# Altium integrated library 860010580021_Altium_WCAP-ATG8_rev20a.IntLib: 195 symbols (part 1 of 2)
Pins are listed as number, name and electrical type; pins without a type are passive.

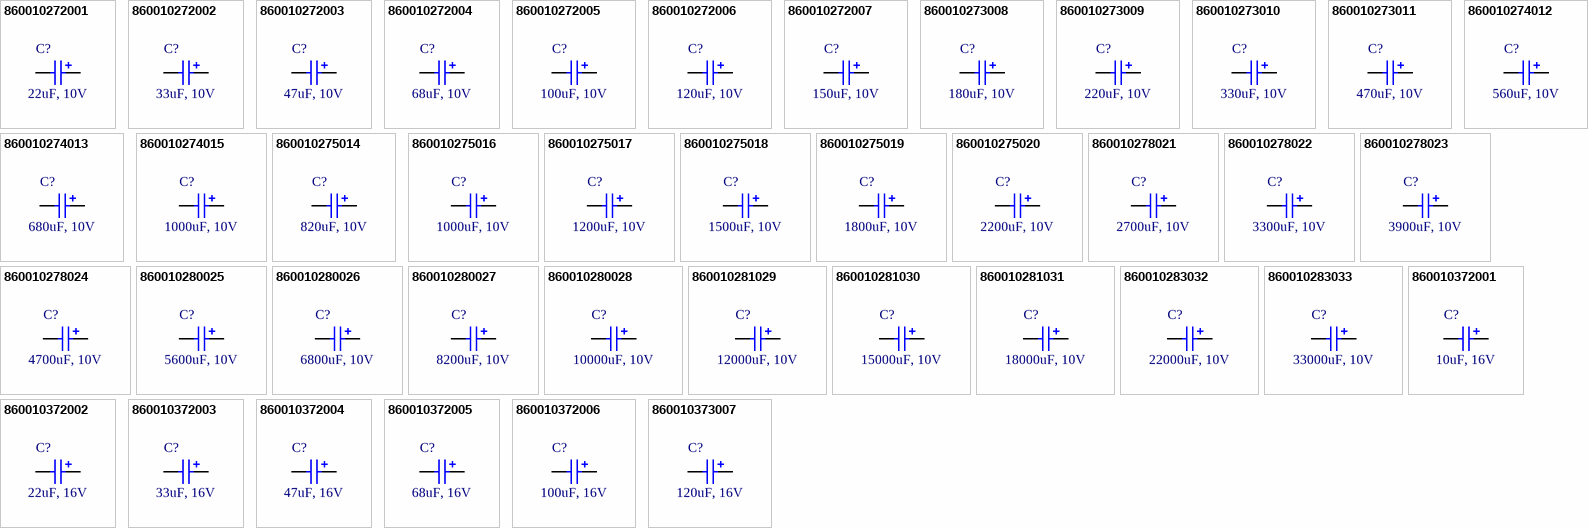
[diagram p0: symbols 860010272001 to 860010373007]

## 860010272001
designator C?, comment 22uF, 10V
WCAP-ATG8 Aluminum Electrolytic Capacitor, Radial, THT, D5xH11mm, 22uF, 10V; Manufacturer Part Number: 860010272001; Manufacturer: Wurth Elektronik; Dissipation Factor: 19%; Endurance: 2000h; Leakage Current: 3uA; Ripple Current: 66mA; Capacitance Tolerance: +/-20%; Rated Voltage: 10VDC; Technical Reference: ATBC110220M010DSPA3B000; ComponentLink1Description: Manufacturer; ComponentLink1URL: http://www.we-online.de; ComponentLink2Description: Datasheet; ComponentLink2URL: https://www.we-online.com/catalog/datasheet/860010272001.pdf; Height: 11mm; Mounting Technology: THT; Operating Temperature: -40 to +85degC; Packaging: Ammo Pack; Published Date: May 2020; Capacitance: 22uF; Diameter: 5mm
footprint WCAP-ATG8_5x11
pins: 1 N, 2 P

## 860010272002
designator C?, comment 33uF, 10V
WCAP-ATG8 Aluminum Electrolytic Capacitor, Radial, THT, D5xH11mm, 33uF, 10V; Manufacturer Part Number: 860010272002; Manufacturer: Wurth Elektronik; Dissipation Factor: 19%; Endurance: 2000h; Leakage Current: 3.3uA; Ripple Current: 88mA; Capacitance Tolerance: +/-20%; Rated Voltage: 10VDC; Technical Reference: ATBC110330M010DSPA3B000; ComponentLink1Description: Manufacturer; ComponentLink1URL: http://www.we-online.de; ComponentLink2Description: Datasheet; ComponentLink2URL: https://www.we-online.com/catalog/datasheet/860010272002.pdf; Height: 11mm; Mounting Technology: THT; Operating Temperature: -40 to +85degC; Packaging: Ammo Pack; Published Date: May 2020; Capacitance: 33uF; Diameter: 5mm
footprint WCAP-ATG8_5x11
pins: 1 N, 2 P

## 860010272003
designator C?, comment 47uF, 10V
WCAP-ATG8 Aluminum Electrolytic Capacitor, Radial, THT, D5xH11mm, 47uF, 10V; Manufacturer Part Number: 860010272003; Manufacturer: Wurth Elektronik; Dissipation Factor: 19%; Endurance: 2000h; Leakage Current: 4.7uA; Ripple Current: 105mA; Capacitance Tolerance: +/-20%; Rated Voltage: 10VDC; Technical Reference: ATBC110470M010DSPA3B000; ComponentLink1Description: Manufacturer; ComponentLink1URL: http://www.we-online.de; ComponentLink2Description: Datasheet; ComponentLink2URL: https://www.we-online.com/catalog/datasheet/860010272003.pdf; Height: 11mm; Mounting Technology: THT; Operating Temperature: -40 to +85degC; Packaging: Ammo Pack; Published Date: May 2020; Capacitance: 47uF; Diameter: 5mm
footprint WCAP-ATG8_5x11
pins: 1 N, 2 P

## 860010272004
designator C?, comment 68uF, 10V
WCAP-ATG8 Aluminum Electrolytic Capacitor, Radial, THT, D5xH11mm, 68uF, 10V; Manufacturer Part Number: 860010272004; Manufacturer: Wurth Elektronik; Dissipation Factor: 19%; Endurance: 2000h; Leakage Current: 6.8uA; Ripple Current: 132mA; Capacitance Tolerance: +/-20%; Rated Voltage: 10VDC; Technical Reference: ATBC110680M010DSPA3B000; ComponentLink1Description: Manufacturer; ComponentLink1URL: http://www.we-online.de; ComponentLink2Description: Datasheet; ComponentLink2URL: https://www.we-online.com/catalog/datasheet/860010272004.pdf; Height: 11mm; Mounting Technology: THT; Operating Temperature: -40 to +85degC; Packaging: Ammo Pack; Published Date: May 2020; Capacitance: 68uF; Diameter: 5mm
footprint WCAP-ATG8_5x11
pins: 1 N, 2 P

## 860010272005
designator C?, comment 100uF, 10V
WCAP-ATG8 Aluminum Electrolytic Capacitor, Radial, THT, D5xH11mm, 100uF, 10V; Manufacturer Part Number: 860010272005; Manufacturer: Wurth Elektronik; Dissipation Factor: 19%; Endurance: 2000h; Leakage Current: 10uA; Ripple Current: 198mA; Capacitance Tolerance: +/-20%; Rated Voltage: 10VDC; Technical Reference: ATBC110101M010DSPA3B000; ComponentLink1Description: Manufacturer; ComponentLink1URL: http://www.we-online.de; ComponentLink2Description: Datasheet; ComponentLink2URL: https://www.we-online.com/catalog/datasheet/860010272005.pdf; Height: 11mm; Mounting Technology: THT; Operating Temperature: -40 to +85degC; Packaging: Ammo Pack; Published Date: May 2020; Capacitance: 100uF; Diameter: 5mm
footprint WCAP-ATG8_5x11
pins: 1 N, 2 P

## 860010272006
designator C?, comment 120uF, 10V
WCAP-ATG8 Aluminum Electrolytic Capacitor, Radial, THT, D5xH11mm, 120uF, 10V; Manufacturer Part Number: 860010272006; Manufacturer: Wurth Elektronik; Dissipation Factor: 19%; Endurance: 2000h; Leakage Current: 12uA; Ripple Current: 209mA; Capacitance Tolerance: +/-20%; Rated Voltage: 10VDC; Technical Reference: ATBC110121M010DSPA3B000; ComponentLink1Description: Manufacturer; ComponentLink1URL: http://www.we-online.de; ComponentLink2Description: Datasheet; ComponentLink2URL: https://www.we-online.com/catalog/datasheet/860010272006.pdf; Height: 11mm; Mounting Technology: THT; Operating Temperature: -40 to +85degC; Packaging: Ammo Pack; Published Date: May 2020; Capacitance: 120uF; Diameter: 5mm
footprint WCAP-ATG8_5x11
pins: 1 N, 2 P

## 860010272007
designator C?, comment 150uF, 10V
WCAP-ATG8 Aluminum Electrolytic Capacitor, Radial, THT, D5xH11mm, 150uF, 10V; Manufacturer Part Number: 860010272007; Manufacturer: Wurth Elektronik; Dissipation Factor: 19%; Endurance: 2000h; Leakage Current: 15uA; Ripple Current: 231mA; Capacitance Tolerance: +/-20%; Rated Voltage: 10VDC; Technical Reference: ATBC110151M010DSPA3B000; ComponentLink1Description: Manufacturer; ComponentLink1URL: http://www.we-online.de; ComponentLink2Description: Datasheet; ComponentLink2URL: https://www.we-online.com/catalog/datasheet/860010272007.pdf; Height: 11mm; Mounting Technology: THT; Operating Temperature: -40 to +85degC; Packaging: Ammo Pack; Published Date: May 2020; Capacitance: 150uF; Diameter: 5mm
footprint WCAP-ATG8_5x11
pins: 1 N, 2 P

## 860010273008
designator C?, comment 180uF, 10V
WCAP-ATG8 Aluminum Electrolytic Capacitor, Radial, THT, D6.3xH11mm, 180uF, 10V; Manufacturer Part Number: 860010273008; Manufacturer: Wurth Elektronik; Dissipation Factor: 19%; Endurance: 2000h; Leakage Current: 18uA; Ripple Current: 253mA; Capacitance Tolerance: +/-20%; Rated Voltage: 10VDC; Technical Reference: ATBD110181M010DSPA4B000; ComponentLink1Description: Manufacturer; ComponentLink1URL: http://www.we-online.de; ComponentLink2Description: Datasheet; ComponentLink2URL: https://www.we-online.com/catalog/datasheet/860010273008.pdf; Height: 11mm; Mounting Technology: THT; Operating Temperature: -40 to +85degC; Packaging: Ammo Pack; Published Date: May 2020; Capacitance: 180uF; Diameter: 6.3mm
footprint WCAP-ATG8_6.3x11
pins: 1 N, 2 P

## 860010273009
designator C?, comment 220uF, 10V
WCAP-ATG8 Aluminum Electrolytic Capacitor, Radial, THT, D6.3xH11mm, 220uF, 10V; Manufacturer Part Number: 860010273009; Manufacturer: Wurth Elektronik; Dissipation Factor: 19%; Endurance: 2000h; Leakage Current: 22uA; Ripple Current: 294mA; Capacitance Tolerance: +/-20%; Rated Voltage: 10VDC; Technical Reference: ATBD110221M010DSPA4B000; ComponentLink1Description: Manufacturer; ComponentLink1URL: http://www.we-online.de; ComponentLink2Description: Datasheet; ComponentLink2URL: https://www.we-online.com/catalog/datasheet/860010273009.pdf; Height: 11mm; Mounting Technology: THT; Operating Temperature: -40 to +85degC; Packaging: Ammo Pack; Published Date: May 2020; Capacitance: 220uF; Diameter: 6.3mm
footprint WCAP-ATG8_6.3x11
pins: 1 N, 2 P

## 860010273010
designator C?, comment 330uF, 10V
WCAP-ATG8 Aluminum Electrolytic Capacitor, Radial, THT, D6.3xH11mm, 330uF, 10V; Manufacturer Part Number: 860010273010; Manufacturer: Wurth Elektronik; Dissipation Factor: 19%; Endurance: 2000h; Leakage Current: 33uA; Ripple Current: 363mA; Capacitance Tolerance: +/-20%; Rated Voltage: 10VDC; Technical Reference: ATBD110331M010DSPA4B000; ComponentLink1Description: Manufacturer; ComponentLink1URL: http://www.we-online.de; ComponentLink2Description: Datasheet; ComponentLink2URL: https://www.we-online.com/catalog/datasheet/860010273010.pdf; Height: 11mm; Mounting Technology: THT; Operating Temperature: -40 to +85degC; Packaging: Ammo Pack; Published Date: May 2020; Capacitance: 330uF; Diameter: 6.3mm
footprint WCAP-ATG8_6.3x11
pins: 1 N, 2 P

## 860010273011
designator C?, comment 470uF, 10V
WCAP-ATG8 Aluminum Electrolytic Capacitor, Radial, THT, D6.3xH11mm, 470uF, 10V; Manufacturer Part Number: 860010273011; Manufacturer: Wurth Elektronik; Dissipation Factor: 19%; Endurance: 2000h; Leakage Current: 47uA; Ripple Current: 418mA; Capacitance Tolerance: +/-20%; Rated Voltage: 10VDC; Technical Reference: ATBD110471M010DSPA4B000; ComponentLink1Description: Manufacturer; ComponentLink1URL: http://www.we-online.de; ComponentLink2Description: Datasheet; ComponentLink2URL: https://www.we-online.com/catalog/datasheet/860010273011.pdf; Height: 11mm; Mounting Technology: THT; Operating Temperature: -40 to +85degC; Packaging: Ammo Pack; Published Date: May 2020; Capacitance: 470uF; Diameter: 6.3mm
footprint WCAP-ATG8_6.3x11
pins: 1 N, 2 P

## 860010274012
designator C?, comment 560uF, 10V
WCAP-ATG8 Aluminum Electrolytic Capacitor, Radial, THT, D8xH11.5mm, 560uF, 10V; Manufacturer Part Number: 860010274012; Manufacturer: Wurth Elektronik; Dissipation Factor: 19%; Endurance: 2000h; Leakage Current: 56uA; Ripple Current: 506mA; Capacitance Tolerance: +/-20%; Rated Voltage: 10VDC; Technical Reference: ATBE115561M010DSPA7B000; ComponentLink1Description: Manufacturer; ComponentLink1URL: http://www.we-online.de; ComponentLink2Description: Datasheet; ComponentLink2URL: https://www.we-online.com/catalog/datasheet/860010274012.pdf; Height: 11.5mm; Mounting Technology: THT; Operating Temperature: -40 to +85degC; Packaging: Ammo Pack; Published Date: May 2020; Capacitance: 560uF; Diameter: 8mm
footprint WCAP-ATG8_8x11.5
pins: 1 N, 2 P

## 860010274013
designator C?, comment 680uF, 10V
WCAP-ATG8 Aluminum Electrolytic Capacitor, Radial, THT, D8xH11.5mm, 680uF, 10V; Manufacturer Part Number: 860010274013; Manufacturer: Wurth Elektronik; Dissipation Factor: 19%; Endurance: 2000h; Leakage Current: 68uA; Ripple Current: 572mA; Capacitance Tolerance: +/-20%; Rated Voltage: 10VDC; Technical Reference: ATBE115681M010DSPA7B000; ComponentLink1Description: Manufacturer; ComponentLink1URL: http://www.we-online.de; ComponentLink2Description: Datasheet; ComponentLink2URL: https://www.we-online.com/catalog/datasheet/860010274013.pdf; Height: 11.5mm; Mounting Technology: THT; Operating Temperature: -40 to +85degC; Packaging: Ammo Pack; Published Date: May 2020; Capacitance: 680uF; Diameter: 8mm
footprint WCAP-ATG8_8x11.5
pins: 1 N, 2 P

## 860010274015
designator C?, comment 1000uF, 10V
WCAP-ATG8 Aluminum Electrolytic Capacitor, Radial, THT, D8xH16mm, 1000uF, 10V; Manufacturer Part Number: 860010274015; Manufacturer: Wurth Elektronik; Dissipation Factor: 19%; Endurance: 2000h; Leakage Current: 100uA; Ripple Current: 725mA; Capacitance Tolerance: +/-20%; Rated Voltage: 10VDC; Technical Reference: ATBE160102M010DSPA7B000; ComponentLink1Description: Manufacturer; ComponentLink1URL: http://www.we-online.de; ComponentLink2Description: Datasheet; ComponentLink2URL: https://www.we-online.com/catalog/datasheet/860010274015.pdf; Height: 16mm; Mounting Technology: THT; Operating Temperature: -40 to +85degC; Packaging: Ammo Pack; Published Date: May 2020; Capacitance: 1000uF; Diameter: 8mm
footprint WCAP-ATG8_8x16
pins: 1 N, 2 P

## 860010275014
designator C?, comment 820uF, 10V
WCAP-ATG8 Aluminum Electrolytic Capacitor, Radial, THT, D10xH12.5mm, 820uF, 10V; Manufacturer Part Number: 860010275014; Manufacturer: Wurth Elektronik; Dissipation Factor: 19%; Endurance: 2000h; Leakage Current: 82uA; Ripple Current: 671mA; Capacitance Tolerance: +/-20%; Rated Voltage: 10VDC; Technical Reference: ATBF125821M010DSPA9B000; ComponentLink1Description: Manufacturer; ComponentLink1URL: http://www.we-online.de; ComponentLink2Description: Datasheet; ComponentLink2URL: https://www.we-online.com/catalog/datasheet/860010275014.pdf; Height: 12.5mm; Mounting Technology: THT; Operating Temperature: -40 to +85degC; Packaging: Ammo Pack; Published Date: May 2020; Capacitance: 820uF; Diameter: 10mm
footprint WCAP-ATG8_10x12.5
pins: 1 N, 2 P

## 860010275016
designator C?, comment 1000uF, 10V
WCAP-ATG8 Aluminum Electrolytic Capacitor, Radial, THT, D10xH12.5mm, 1000uF, 10V; Manufacturer Part Number: 860010275016; Manufacturer: Wurth Elektronik; Dissipation Factor: 19%; Endurance: 2000h; Leakage Current: 100uA; Ripple Current: 726mA; Capacitance Tolerance: +/-20%; Rated Voltage: 10VDC; Technical Reference: ATBF125102M010DSPA9B000; ComponentLink1Description: Manufacturer; ComponentLink1URL: http://www.we-online.de; ComponentLink2Description: Datasheet; ComponentLink2URL: https://www.we-online.com/catalog/datasheet/860010275016.pdf; Height: 12.5mm; Mounting Technology: THT; Operating Temperature: -40 to +85degC; Packaging: Ammo Pack; Published Date: May 2020; Capacitance: 1000uF; Diameter: 10mm
footprint WCAP-ATG8_10x12.5
pins: 1 N, 2 P

## 860010275017
designator C?, comment 1200uF, 10V
WCAP-ATG8 Aluminum Electrolytic Capacitor, Radial, THT, D10xH16mm, 1200uF, 10V; Manufacturer Part Number: 860010275017; Manufacturer: Wurth Elektronik; Dissipation Factor: 19%; Endurance: 2000h; Leakage Current: 120uA; Ripple Current: 902mA; Capacitance Tolerance: +/-20%; Rated Voltage: 10VDC; Technical Reference: ATBF160122M010DSPAAB000; ComponentLink1Description: Manufacturer; ComponentLink1URL: http://www.we-online.de; ComponentLink2Description: Datasheet; ComponentLink2URL: https://www.we-online.com/catalog/datasheet/860010275017.pdf; Height: 16mm; Mounting Technology: THT; Operating Temperature: -40 to +85degC; Packaging: Ammo Pack; Published Date: May 2020; Capacitance: 1200uF; Diameter: 10mm
footprint WCAP-ATG8_10x16
pins: 1 N, 2 P

## 860010275018
designator C?, comment 1500uF, 10V
WCAP-ATG8 Aluminum Electrolytic Capacitor, Radial, THT, D10xH16mm, 1500uF, 10V; Manufacturer Part Number: 860010275018; Manufacturer: Wurth Elektronik; Dissipation Factor: 19%; Endurance: 2000h; Leakage Current: 150uA; Ripple Current: 1001mA; Capacitance Tolerance: +/-20%; Rated Voltage: 10VDC; Technical Reference: ATBF160152M010DSPAAB000; ComponentLink1Description: Manufacturer; ComponentLink1URL: http://www.we-online.de; ComponentLink2Description: Datasheet; ComponentLink2URL: https://www.we-online.com/catalog/datasheet/860010275018.pdf; Height: 16mm; Mounting Technology: THT; Operating Temperature: -40 to +85degC; Packaging: Ammo Pack; Published Date: May 2020; Capacitance: 1500uF; Diameter: 10mm
footprint WCAP-ATG8_10x16
pins: 1 N, 2 P

## 860010275019
designator C?, comment 1800uF, 10V
WCAP-ATG8 Aluminum Electrolytic Capacitor, Radial, THT, D10xH20mm, 1800uF, 10V; Manufacturer Part Number: 860010275019; Manufacturer: Wurth Elektronik; Dissipation Factor: 19%; Endurance: 2000h; Leakage Current: 180uA; Ripple Current: 1089mA; Capacitance Tolerance: +/-20%; Rated Voltage: 10VDC; Technical Reference: ATBF200182M010DSPAAB000; ComponentLink1Description: Manufacturer; ComponentLink1URL: http://www.we-online.de; ComponentLink2Description: Datasheet; ComponentLink2URL: https://www.we-online.com/catalog/datasheet/860010275019.pdf; Height: 20mm; Mounting Technology: THT; Operating Temperature: -40 to +85degC; Packaging: Ammo Pack; Published Date: May 2020; Capacitance: 1800uF; Diameter: 10mm
footprint WCAP-ATG8_10x20
pins: 1 N, 2 P

## 860010275020
designator C?, comment 2200uF, 10V
WCAP-ATG8 Aluminum Electrolytic Capacitor, Radial, THT, D10xH20mm, 2200uF, 10V; Manufacturer Part Number: 860010275020; Manufacturer: Wurth Elektronik; Dissipation Factor: 19%; Endurance: 2000h; Leakage Current: 220uA; Ripple Current: 1210mA; Capacitance Tolerance: +/-20%; Rated Voltage: 10VDC; Technical Reference: ATBF200222M010DSPAAB000; ComponentLink1Description: Manufacturer; ComponentLink1URL: http://www.we-online.de; ComponentLink2Description: Datasheet; ComponentLink2URL: https://www.we-online.com/catalog/datasheet/860010275020.pdf; Height: 20mm; Mounting Technology: THT; Operating Temperature: -40 to +85degC; Packaging: Ammo Pack; Published Date: May 2020; Capacitance: 2200uF; Diameter: 10mm
footprint WCAP-ATG8_10x20
pins: 1 N, 2 P

## 860010278021
designator C?, comment 2700uF, 10V
WCAP-ATG8 Aluminum Electrolytic Capacitor, Radial, THT, D13xH20mm, 2700uF, 10V; Manufacturer Part Number: 860010278021; Manufacturer: Wurth Elektronik; Dissipation Factor: 19%; Endurance: 2000h; Leakage Current: 270uA; Ripple Current: 1419mA; Capacitance Tolerance: +/-20%; Rated Voltage: 10VDC; Technical Reference: ATBI200272M010DSPACB000; ComponentLink1Description: Manufacturer; ComponentLink1URL: http://www.we-online.de; ComponentLink2Description: Datasheet; ComponentLink2URL: https://www.we-online.com/catalog/datasheet/860010278021.pdf; Height: 20mm; Mounting Technology: THT; Operating Temperature: -40 to +85degC; Packaging: Ammo Pack; Published Date: May 2020; Capacitance: 2700uF; Diameter: 13mm
footprint WCAP-ATG8_13x20
pins: 1 N, 2 P

## 860010278022
designator C?, comment 3300uF, 10V
WCAP-ATG8 Aluminum Electrolytic Capacitor, Radial, THT, D13xH20mm, 3300uF, 10V; Manufacturer Part Number: 860010278022; Manufacturer: Wurth Elektronik; Dissipation Factor: 19%; Endurance: 2000h; Leakage Current: 330uA; Ripple Current: 1540mA; Capacitance Tolerance: +/-20%; Rated Voltage: 10VDC; Technical Reference: ATBI200332M010DSPACB000; ComponentLink1Description: Manufacturer; ComponentLink1URL: http://www.we-online.de; ComponentLink2Description: Datasheet; ComponentLink2URL: https://www.we-online.com/catalog/datasheet/860010278022.pdf; Height: 20mm; Mounting Technology: THT; Operating Temperature: -40 to +85degC; Packaging: Ammo Pack; Published Date: May 2020; Capacitance: 3300uF; Diameter: 13mm
footprint WCAP-ATG8_13x20
pins: 1 N, 2 P

## 860010278023
designator C?, comment 3900uF, 10V
WCAP-ATG8 Aluminum Electrolytic Capacitor, Radial, THT, D13xH20mm, 3900uF, 10V; Manufacturer Part Number: 860010278023; Manufacturer: Wurth Elektronik; Dissipation Factor: 19%; Endurance: 2000h; Leakage Current: 390uA; Ripple Current: 1760mA; Capacitance Tolerance: +/-20%; Rated Voltage: 10VDC; Technical Reference: ATBI200392M010DSPACB000; ComponentLink1Description: Manufacturer; ComponentLink1URL: http://www.we-online.de; ComponentLink2Description: Datasheet; ComponentLink2URL: https://www.we-online.com/catalog/datasheet/860010278023.pdf; Height: 20mm; Mounting Technology: THT; Operating Temperature: -40 to +85degC; Packaging: Ammo Pack; Published Date: May 2020; Capacitance: 3900uF; Diameter: 13mm
footprint WCAP-ATG8_13x20
pins: 1 N, 2 P

## 860010278024
designator C?, comment 4700uF, 10V
WCAP-ATG8 Aluminum Electrolytic Capacitor, Radial, THT, D13xH25mm, 4700uF, 10V; Manufacturer Part Number: 860010278024; Manufacturer: Wurth Elektronik; Dissipation Factor: 19%; Endurance: 2000h; Leakage Current: 470uA; Ripple Current: 1980mA; Capacitance Tolerance: +/-20%; Rated Voltage: 10VDC; Technical Reference: ATBI250472M010DSPACB000; ComponentLink1Description: Manufacturer; ComponentLink1URL: http://www.we-online.de; ComponentLink2Description: Datasheet; ComponentLink2URL: https://www.we-online.com/catalog/datasheet/860010278024.pdf; Height: 25mm; Mounting Technology: THT; Operating Temperature: -40 to +85degC; Packaging: Ammo Pack; Published Date: May 2020; Capacitance: 4700uF; Diameter: 13mm
footprint WCAP-ATG8_13x25
pins: 1 N, 2 P

## 860010280025
designator C?, comment 5600uF, 10V
WCAP-ATG8 Aluminum Electrolytic Capacitor, Radial, THT, D16xH25mm, 5600uF, 10V; Manufacturer Part Number: 860010280025; Manufacturer: Wurth Elektronik; Dissipation Factor: 19%; Endurance: 2000h; Leakage Current: 560uA; Ripple Current: 2189mA; Capacitance Tolerance: +/-20%; Rated Voltage: 10VDC; Technical Reference: ATBK250562M010DSPAEB000; ComponentLink1Description: Manufacturer; ComponentLink1URL: http://www.we-online.de; ComponentLink2Description: Datasheet; ComponentLink2URL: https://www.we-online.com/catalog/datasheet/860010280025.pdf; Height: 25mm; Mounting Technology: THT; Operating Temperature: -40 to +85degC; Packaging: Ammo Pack; Published Date: May 2020; Capacitance: 5600uF; Diameter: 16mm
footprint WCAP-ATG8_16x25
pins: 1 N, 2 P

## 860010280026
designator C?, comment 6800uF, 10V
WCAP-ATG8 Aluminum Electrolytic Capacitor, Radial, THT, D16xH25mm, 6800uF, 10V; Manufacturer Part Number: 860010280026; Manufacturer: Wurth Elektronik; Dissipation Factor: 19%; Endurance: 2000h; Leakage Current: 680uA; Ripple Current: 2475mA; Capacitance Tolerance: +/-20%; Rated Voltage: 10VDC; Technical Reference: ATBK250682M010DSPAEB000; ComponentLink1Description: Manufacturer; ComponentLink1URL: http://www.we-online.de; ComponentLink2Description: Datasheet; ComponentLink2URL: https://www.we-online.com/catalog/datasheet/860010280026.pdf; Height: 25mm; Mounting Technology: THT; Operating Temperature: -40 to +85degC; Packaging: Ammo Pack; Published Date: May 2020; Capacitance: 6800uF; Diameter: 16mm
footprint WCAP-ATG8_16x25
pins: 1 N, 2 P

## 860010280027
designator C?, comment 8200uF, 10V
WCAP-ATG8 Aluminum Electrolytic Capacitor, Radial, THT, D16xH31.5mm, 8200uF, 10V; Manufacturer Part Number: 860010280027; Manufacturer: Wurth Elektronik; Dissipation Factor: 19%; Endurance: 2000h; Leakage Current: 820uA; Ripple Current: 2541mA; Capacitance Tolerance: +/-20%; Rated Voltage: 10VDC; Technical Reference: ATBK315822M010DSPADB000; ComponentLink1Description: Manufacturer; ComponentLink1URL: http://www.we-online.de; ComponentLink2Description: Datasheet; ComponentLink2URL: https://www.we-online.com/catalog/datasheet/860010280027.pdf; Height: 31.5mm; Mounting Technology: THT; Operating Temperature: -40 to +85degC; Packaging: Ammo Pack; Published Date: May 2020; Capacitance: 8200uF; Diameter: 16mm
footprint WCAP-ATG8_16x31.5
pins: 1 N, 2 P

## 860010280028
designator C?, comment 10000uF, 10V
WCAP-ATG8 Aluminum Electrolytic Capacitor, Radial, THT, D16xH35.5mm, 10000uF, 10V; Manufacturer Part Number: 860010280028; Manufacturer: Wurth Elektronik; Dissipation Factor: 19%; Endurance: 2000h; Leakage Current: 1000uA; Ripple Current: 2640mA; Capacitance Tolerance: +/-20%; Rated Voltage: 10VDC; Technical Reference: ATBK355103M010DSPADB000; ComponentLink1Description: Manufacturer; ComponentLink1URL: http://www.we-online.de; ComponentLink2Description: Datasheet; ComponentLink2URL: https://www.we-online.com/catalog/datasheet/860010280028.pdf; Height: 35.5mm; Mounting Technology: THT; Operating Temperature: -40 to +85degC; Packaging: Ammo Pack; Published Date: May 2020; Capacitance: 10000uF; Diameter: 16mm
footprint WCAP-ATG8_16x35.5
pins: 1 N, 2 P

## 860010281029
designator C?, comment 12000uF, 10V
WCAP-ATG8 Aluminum Electrolytic Capacitor, Radial, THT, D18xH35.5mm, 12000uF, 10V; Manufacturer Part Number: 860010281029; Manufacturer: Wurth Elektronik; Dissipation Factor: 19%; Endurance: 2000h; Leakage Current: 1200uA; Ripple Current: 3025mA; Capacitance Tolerance: +/-20%; Rated Voltage: 10VDC; Technical Reference: ATBL355123M010DSPAEB000; ComponentLink1Description: Manufacturer; ComponentLink1URL: http://www.we-online.de; ComponentLink2Description: Datasheet; ComponentLink2URL: https://www.we-online.com/catalog/datasheet/860010281029.pdf; Height: 35.5mm; Mounting Technology: THT; Operating Temperature: -40 to +85degC; Packaging: Ammo Pack; Published Date: May 2020; Capacitance: 12000uF; Diameter: 18mm
footprint WCAP-ATG8_18x35.5
pins: 1 N, 2 P

## 860010281030
designator C?, comment 15000uF, 10V
WCAP-ATG8 Aluminum Electrolytic Capacitor, Radial, THT, D18xH35.5mm, 15000uF, 10V; Manufacturer Part Number: 860010281030; Manufacturer: Wurth Elektronik; Dissipation Factor: 19%; Endurance: 2000h; Leakage Current: 1500uA; Ripple Current: 3310mA; Capacitance Tolerance: +/-20%; Rated Voltage: 10VDC; Technical Reference: ATBL355153M010DSPAEB000; ComponentLink1Description: Manufacturer; ComponentLink1URL: http://www.we-online.de; ComponentLink2Description: Datasheet; ComponentLink2URL: https://www.we-online.com/catalog/datasheet/860010281030.pdf; Height: 35.5mm; Mounting Technology: THT; Operating Temperature: -40 to +85degC; Packaging: Ammo Pack; Published Date: May 2020; Capacitance: 15000uF; Diameter: 18mm
footprint WCAP-ATG8_18x35.5
pins: 1 N, 2 P

## 860010281031
designator C?, comment 18000uF, 10V
WCAP-ATG8 Aluminum Electrolytic Capacitor, Radial, THT, D18xH41mm, 18000uF, 10V; Manufacturer Part Number: 860010281031; Manufacturer: Wurth Elektronik; Dissipation Factor: 19%; Endurance: 2000h; Leakage Current: 1800uA; Ripple Current: 3410mA; Capacitance Tolerance: +/-20%; Rated Voltage: 10VDC; Technical Reference: ATBL410183M010DSPS1B000; ComponentLink1Description: Manufacturer; ComponentLink1URL: http://www.we-online.de; ComponentLink2Description: Datasheet; ComponentLink2URL: https://www.we-online.com/catalog/datasheet/860010281031.pdf; Height: 41mm; Mounting Technology: THT; Operating Temperature: -40 to +85degC; Packaging: Ammo Pack; Published Date: May 2020; Capacitance: 18000uF; Diameter: 18mm
footprint WCAP-ATG8_18x41
pins: 1 N, 2 P

## 860010283032
designator C?, comment 22000uF, 10V
WCAP-ATG8 Aluminum Electrolytic Capacitor, Radial, THT, D22xH41mm, 22000uF, 10V; Manufacturer Part Number: 860010283032; Manufacturer: Wurth Elektronik; Dissipation Factor: 19%; Endurance: 2000h; Leakage Current: 2200uA; Ripple Current: 4092mA; Capacitance Tolerance: +/-20%; Rated Voltage: 10VDC; Technical Reference: ATBN410223M010DSPS2B000; ComponentLink1Description: Manufacturer; ComponentLink1URL: http://www.we-online.de; ComponentLink2Description: Datasheet; ComponentLink2URL: https://www.we-online.com/catalog/datasheet/860010283032.pdf; Height: 41mm; Mounting Technology: THT; Operating Temperature: -40 to +85degC; Packaging: Ammo Pack; Published Date: May 2020; Capacitance: 22000uF; Diameter: 22mm
footprint WCAP-ATG8_22x41
pins: 1 N, 2 P

## 860010283033
designator C?, comment 33000uF, 10V
WCAP-ATG8 Aluminum Electrolytic Capacitor, Radial, THT, D22xH51mm, 33000uF, 10V; Manufacturer Part Number: 860010283033; Manufacturer: Wurth Elektronik; Dissipation Factor: 19%; Endurance: 2000h; Leakage Current: 3300uA; Ripple Current: 4620mA; Capacitance Tolerance: +/-20%; Rated Voltage: 10VDC; Technical Reference: ATBN510333M010DSPS2B000; ComponentLink1Description: Manufacturer; ComponentLink1URL: http://www.we-online.de; ComponentLink2Description: Datasheet; ComponentLink2URL: https://www.we-online.com/catalog/datasheet/860010283033.pdf; Height: 51mm; Mounting Technology: THT; Operating Temperature: -40 to +85degC; Packaging: Ammo Pack; Published Date: May 2020; Capacitance: 33000uF; Diameter: 22mm
footprint WCAP-ATG8_22x51
pins: 1 N, 2 P

## 860010372001
designator C?, comment 10uF, 16V
WCAP-ATG8 Aluminum Electrolytic Capacitor, Radial, THT, D5xH11mm, 10uF, 16V; Manufacturer Part Number: 860010372001; Manufacturer: Wurth Elektronik; Dissipation Factor: 16%; Endurance: 2000h; Leakage Current: 3uA; Ripple Current: 44mA; Capacitance Tolerance: +/-20%; Rated Voltage: 16VDC; Technical Reference: ATBC110100M016DSPA3B000; ComponentLink1Description: Manufacturer; ComponentLink1URL: http://www.we-online.de; ComponentLink2Description: Datasheet; ComponentLink2URL: https://www.we-online.com/catalog/datasheet/860010372001.pdf; Height: 11mm; Mounting Technology: THT; Operating Temperature: -40 to +85degC; Packaging: Ammo Pack; Published Date: May 2020; Capacitance: 10uF; Diameter: 5mm
footprint WCAP-ATG8_5x11
pins: 1 N, 2 P

## 860010372002
designator C?, comment 22uF, 16V
WCAP-ATG8 Aluminum Electrolytic Capacitor, Radial, THT, D5xH11mm, 22uF, 16V; Manufacturer Part Number: 860010372002; Manufacturer: Wurth Elektronik; Dissipation Factor: 16%; Endurance: 2000h; Leakage Current: 3.52uA; Ripple Current: 83mA; Capacitance Tolerance: +/-20%; Rated Voltage: 16VDC; Technical Reference: ATBC110220M016DSPA3B000; ComponentLink1Description: Manufacturer; ComponentLink1URL: http://www.we-online.de; ComponentLink2Description: Datasheet; ComponentLink2URL: https://www.we-online.com/catalog/datasheet/860010372002.pdf; Height: 11mm; Mounting Technology: THT; Operating Temperature: -40 to +85degC; Packaging: Ammo Pack; Published Date: May 2020; Capacitance: 22uF; Diameter: 5mm
footprint WCAP-ATG8_5x11
pins: 1 N, 2 P

## 860010372003
designator C?, comment 33uF, 16V
WCAP-ATG8 Aluminum Electrolytic Capacitor, Radial, THT, D5xH11mm, 33uF, 16V; Manufacturer Part Number: 860010372003; Manufacturer: Wurth Elektronik; Dissipation Factor: 16%; Endurance: 2000h; Leakage Current: 5.28uA; Ripple Current: 84mA; Capacitance Tolerance: +/-20%; Rated Voltage: 16VDC; Technical Reference: ATBC110330M016DSPA3B000; ComponentLink1Description: Manufacturer; ComponentLink1URL: http://www.we-online.de; ComponentLink2Description: Datasheet; ComponentLink2URL: https://www.we-online.com/catalog/datasheet/860010372003.pdf; Height: 11mm; Mounting Technology: THT; Operating Temperature: -40 to +85degC; Packaging: Ammo Pack; Published Date: May 2020; Capacitance: 33uF; Diameter: 5mm
footprint WCAP-ATG8_5x11
pins: 1 N, 2 P

## 860010372004
designator C?, comment 47uF, 16V
WCAP-ATG8 Aluminum Electrolytic Capacitor, Radial, THT, D5xH11mm, 47uF, 16V; Manufacturer Part Number: 860010372004; Manufacturer: Wurth Elektronik; Dissipation Factor: 16%; Endurance: 2000h; Leakage Current: 7.52uA; Ripple Current: 132mA; Capacitance Tolerance: +/-20%; Rated Voltage: 16VDC; Technical Reference: ATBC110470M016DSPA3B000; ComponentLink1Description: Manufacturer; ComponentLink1URL: http://www.we-online.de; ComponentLink2Description: Datasheet; ComponentLink2URL: https://www.we-online.com/catalog/datasheet/860010372004.pdf; Height: 11mm; Mounting Technology: THT; Operating Temperature: -40 to +85degC; Packaging: Ammo Pack; Published Date: May 2020; Capacitance: 47uF; Diameter: 5mm
footprint WCAP-ATG8_5x11
pins: 1 N, 2 P

## 860010372005
designator C?, comment 68uF, 16V
WCAP-ATG8 Aluminum Electrolytic Capacitor, Radial, THT, D5xH11mm, 68uF, 16V; Manufacturer Part Number: 860010372005; Manufacturer: Wurth Elektronik; Dissipation Factor: 16%; Endurance: 2000h; Leakage Current: 10.88uA; Ripple Current: 149mA; Capacitance Tolerance: +/-20%; Rated Voltage: 16VDC; Technical Reference: ATBC110680M016DSPA3B000; ComponentLink1Description: Manufacturer; ComponentLink1URL: http://www.we-online.de; ComponentLink2Description: Datasheet; ComponentLink2URL: https://www.we-online.com/catalog/datasheet/860010372005.pdf; Height: 11mm; Mounting Technology: THT; Operating Temperature: -40 to +85degC; Packaging: Ammo Pack; Published Date: May 2020; Capacitance: 68uF; Diameter: 5mm
footprint WCAP-ATG8_5x11
pins: 1 N, 2 P

## 860010372006
designator C?, comment 100uF, 16V
WCAP-ATG8 Aluminum Electrolytic Capacitor, Radial, THT, D5xH11mm, 100uF, 16V; Manufacturer Part Number: 860010372006; Manufacturer: Wurth Elektronik; Dissipation Factor: 16%; Endurance: 2000h; Leakage Current: 16uA; Ripple Current: 176mA; Capacitance Tolerance: +/-20%; Rated Voltage: 16VDC; Technical Reference: ATBC110101M016DSPA3B000; ComponentLink1Description: Manufacturer; ComponentLink1URL: http://www.we-online.de; ComponentLink2Description: Datasheet; ComponentLink2URL: https://www.we-online.com/catalog/datasheet/860010372006.pdf; Height: 11mm; Mounting Technology: THT; Operating Temperature: -40 to +85degC; Packaging: Ammo Pack; Published Date: May 2020; Capacitance: 100uF; Diameter: 5mm
footprint WCAP-ATG8_5x11
pins: 1 N, 2 P

## 860010373007
designator C?, comment 120uF, 16V
WCAP-ATG8 Aluminum Electrolytic Capacitor, Radial, THT, D6.3xH11mm, 120uF, 16V; Manufacturer Part Number: 860010373007; Manufacturer: Wurth Elektronik; Dissipation Factor: 16%; Endurance: 2000h; Leakage Current: 19.2uA; Ripple Current: 231mA; Capacitance Tolerance: +/-20%; Rated Voltage: 16VDC; Technical Reference: ATBD110121M016DSPA4B000; ComponentLink1Description: Manufacturer; ComponentLink1URL: http://www.we-online.de; ComponentLink2Description: Datasheet; ComponentLink2URL: https://www.we-online.com/catalog/datasheet/860010373007.pdf; Height: 11mm; Mounting Technology: THT; Operating Temperature: -40 to +85degC; Packaging: Ammo Pack; Published Date: May 2020; Capacitance: 120uF; Diameter: 6.3mm
footprint WCAP-ATG8_6.3x11
pins: 1 N, 2 P

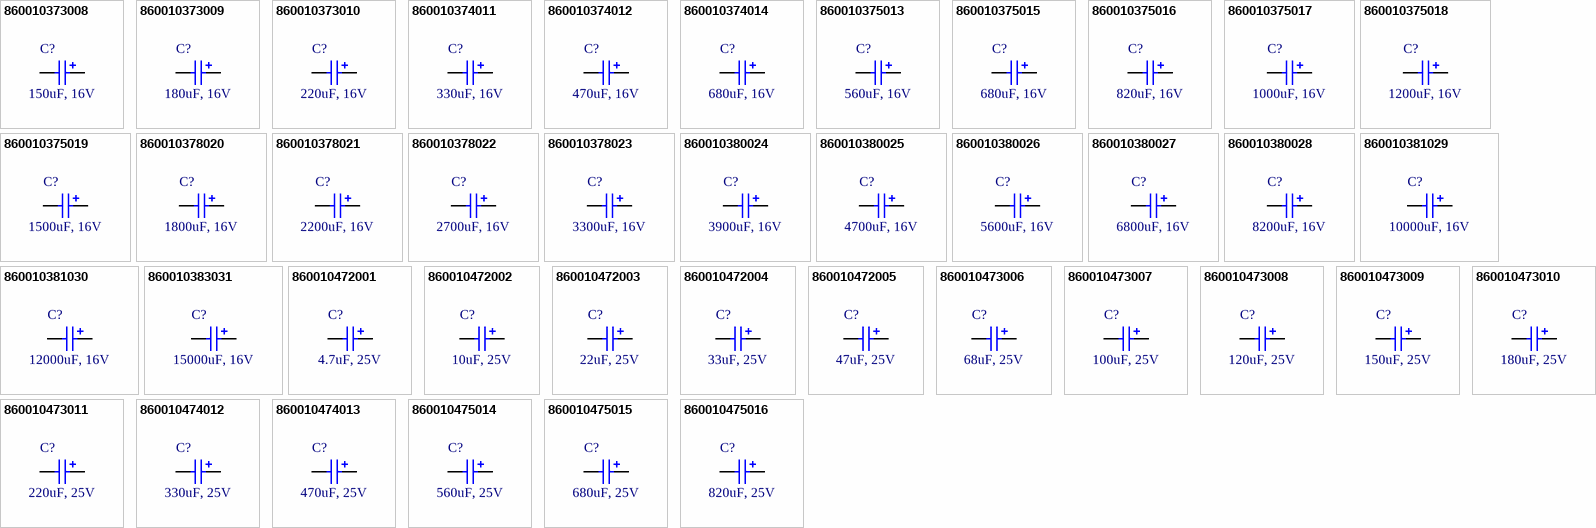
[diagram p1: symbols 860010373008 to 860010475016]

## 860010373008
designator C?, comment 150uF, 16V
WCAP-ATG8 Aluminum Electrolytic Capacitor, Radial, THT, D6.3xH11mm, 150uF, 16V; Manufacturer Part Number: 860010373008; Manufacturer: Wurth Elektronik; Dissipation Factor: 16%; Endurance: 2000h; Leakage Current: 24uA; Ripple Current: 253mA; Capacitance Tolerance: +/-20%; Rated Voltage: 16VDC; Technical Reference: ATBD110151M016DSPA4B000; ComponentLink1Description: Manufacturer; ComponentLink1URL: http://www.we-online.de; ComponentLink2Description: Datasheet; ComponentLink2URL: https://www.we-online.com/catalog/datasheet/860010373008.pdf; Height: 11mm; Mounting Technology: THT; Operating Temperature: -40 to +85degC; Packaging: Ammo Pack; Published Date: May 2020; Capacitance: 150uF; Diameter: 6.3mm
footprint WCAP-ATG8_6.3x11
pins: 1 N, 2 P

## 860010373009
designator C?, comment 180uF, 16V
WCAP-ATG8 Aluminum Electrolytic Capacitor, Radial, THT, D6.3xH11mm, 180uF, 16V; Manufacturer Part Number: 860010373009; Manufacturer: Wurth Elektronik; Dissipation Factor: 16%; Endurance: 2000h; Leakage Current: 28.8uA; Ripple Current: 275mA; Capacitance Tolerance: +/-20%; Rated Voltage: 16VDC; Technical Reference: ATBD110181M016DSPA4B000; ComponentLink1Description: Manufacturer; ComponentLink1URL: http://www.we-online.de; ComponentLink2Description: Datasheet; ComponentLink2URL: https://www.we-online.com/catalog/datasheet/860010373009.pdf; Height: 11mm; Mounting Technology: THT; Operating Temperature: -40 to +85degC; Packaging: Ammo Pack; Published Date: May 2020; Capacitance: 180uF; Diameter: 6.3mm
footprint WCAP-ATG8_6.3x11
pins: 1 N, 2 P

## 860010373010
designator C?, comment 220uF, 16V
WCAP-ATG8 Aluminum Electrolytic Capacitor, Radial, THT, D6.3xH11mm, 220uF, 16V; Manufacturer Part Number: 860010373010; Manufacturer: Wurth Elektronik; Dissipation Factor: 16%; Endurance: 2000h; Leakage Current: 35.2uA; Ripple Current: 308mA; Capacitance Tolerance: +/-20%; Rated Voltage: 16VDC; Technical Reference: ATBD110221M016DSPA4B000; ComponentLink1Description: Manufacturer; ComponentLink1URL: http://www.we-online.de; ComponentLink2Description: Datasheet; ComponentLink2URL: https://www.we-online.com/catalog/datasheet/860010373010.pdf; Height: 11mm; Mounting Technology: THT; Operating Temperature: -40 to +85degC; Packaging: Ammo Pack; Published Date: May 2020; Capacitance: 220uF; Diameter: 6.3mm
footprint WCAP-ATG8_6.3x11
pins: 1 N, 2 P

## 860010374011
designator C?, comment 330uF, 16V
WCAP-ATG8 Aluminum Electrolytic Capacitor, Radial, THT, D8xH11.5mm, 330uF, 16V; Manufacturer Part Number: 860010374011; Manufacturer: Wurth Elektronik; Dissipation Factor: 16%; Endurance: 2000h; Leakage Current: 52.8uA; Ripple Current: 407mA; Capacitance Tolerance: +/-20%; Rated Voltage: 16VDC; Technical Reference: ATBE115331M016DSPA7B000; ComponentLink1Description: Manufacturer; ComponentLink1URL: http://www.we-online.de; ComponentLink2Description: Datasheet; ComponentLink2URL: https://www.we-online.com/catalog/datasheet/860010374011.pdf; Height: 11.5mm; Mounting Technology: THT; Operating Temperature: -40 to +85degC; Packaging: Ammo Pack; Published Date: May 2020; Capacitance: 330uF; Diameter: 8mm
footprint WCAP-ATG8_8x11.5
pins: 1 N, 2 P

## 860010374012
designator C?, comment 470uF, 16V
WCAP-ATG8 Aluminum Electrolytic Capacitor, Radial, THT, D8xH11.5mm, 470uF, 16V; Manufacturer Part Number: 860010374012; Manufacturer: Wurth Elektronik; Dissipation Factor: 16%; Endurance: 2000h; Leakage Current: 75.2uA; Ripple Current: 517mA; Capacitance Tolerance: +/-20%; Rated Voltage: 16VDC; Technical Reference: ATBE115471M016DSPA7B000; ComponentLink1Description: Manufacturer; ComponentLink1URL: http://www.we-online.de; ComponentLink2Description: Datasheet; ComponentLink2URL: https://www.we-online.com/catalog/datasheet/860010374012.pdf; Height: 11.5mm; Mounting Technology: THT; Operating Temperature: -40 to +85degC; Packaging: Ammo Pack; Published Date: May 2020; Capacitance: 470uF; Diameter: 8mm
footprint WCAP-ATG8_8x11.5
pins: 1 N, 2 P

## 860010374014
designator C?, comment 680uF, 16V
WCAP-ATG8 Aluminum Electrolytic Capacitor, Radial, THT, D8xH16mm, 680uF, 16V; Manufacturer Part Number: 860010374014; Manufacturer: Wurth Elektronik; Dissipation Factor: 16%; Endurance: 2000h; Leakage Current: 108.8uA; Ripple Current: 640mA; Capacitance Tolerance: +/-20%; Rated Voltage: 16VDC; Technical Reference: ATBE160681M016DSPA7B000; ComponentLink1Description: Manufacturer; ComponentLink1URL: http://www.we-online.de; ComponentLink2Description: Datasheet; ComponentLink2URL: https://www.we-online.com/catalog/datasheet/860010374014.pdf; Height: 16mm; Mounting Technology: THT; Operating Temperature: -40 to +85degC; Packaging: Ammo Pack; Published Date: May 2020; Capacitance: 680uF; Diameter: 8mm
footprint WCAP-ATG8_8x16
pins: 1 N, 2 P

## 860010375013
designator C?, comment 560uF, 16V
WCAP-ATG8 Aluminum Electrolytic Capacitor, Radial, THT, D10xH12.5mm, 560uF, 16V; Manufacturer Part Number: 860010375013; Manufacturer: Wurth Elektronik; Dissipation Factor: 16%; Endurance: 2000h; Leakage Current: 89.6uA; Ripple Current: 572mA; Capacitance Tolerance: +/-20%; Rated Voltage: 16VDC; Technical Reference: ATBF125561M016DSPA9B000; ComponentLink1Description: Manufacturer; ComponentLink1URL: http://www.we-online.de; ComponentLink2Description: Datasheet; ComponentLink2URL: https://www.we-online.com/catalog/datasheet/860010375013.pdf; Height: 12.5mm; Mounting Technology: THT; Operating Temperature: -40 to +85degC; Packaging: Ammo Pack; Published Date: May 2020; Capacitance: 560uF; Diameter: 10mm
footprint WCAP-ATG8_10x12.5
pins: 1 N, 2 P

## 860010375015
designator C?, comment 680uF, 16V
WCAP-ATG8 Aluminum Electrolytic Capacitor, Radial, THT, D10xH12.5mm, 680uF, 16V; Manufacturer Part Number: 860010375015; Manufacturer: Wurth Elektronik; Dissipation Factor: 16%; Endurance: 2000h; Leakage Current: 108.8uA; Ripple Current: 682mA; Capacitance Tolerance: +/-20%; Rated Voltage: 16VDC; Technical Reference: ATBF125681M016DSPA9B000; ComponentLink1Description: Manufacturer; ComponentLink1URL: http://www.we-online.de; ComponentLink2Description: Datasheet; ComponentLink2URL: https://www.we-online.com/catalog/datasheet/860010375015.pdf; Height: 12.5mm; Mounting Technology: THT; Operating Temperature: -40 to +85degC; Packaging: Ammo Pack; Published Date: May 2020; Capacitance: 680uF; Diameter: 10mm
footprint WCAP-ATG8_10x12.5
pins: 1 N, 2 P

## 860010375016
designator C?, comment 820uF, 16V
WCAP-ATG8 Aluminum Electrolytic Capacitor, Radial, THT, D10xH16mm, 820uF, 16V; Manufacturer Part Number: 860010375016; Manufacturer: Wurth Elektronik; Dissipation Factor: 16%; Endurance: 2000h; Leakage Current: 131.2uA; Ripple Current: 803mA; Capacitance Tolerance: +/-20%; Rated Voltage: 16VDC; Technical Reference: ATBF160821M016DSPAAB000; ComponentLink1Description: Manufacturer; ComponentLink1URL: http://www.we-online.de; ComponentLink2Description: Datasheet; ComponentLink2URL: https://www.we-online.com/catalog/datasheet/860010375016.pdf; Height: 16mm; Mounting Technology: THT; Operating Temperature: -40 to +85degC; Packaging: Ammo Pack; Published Date: May 2020; Capacitance: 820uF; Diameter: 10mm
footprint WCAP-ATG8_10x16
pins: 1 N, 2 P

## 860010375017
designator C?, comment 1000uF, 16V
WCAP-ATG8 Aluminum Electrolytic Capacitor, Radial, THT, D10xH16mm, 1000uF, 16V; Manufacturer Part Number: 860010375017; Manufacturer: Wurth Elektronik; Dissipation Factor: 16%; Endurance: 2000h; Leakage Current: 160uA; Ripple Current: 869mA; Capacitance Tolerance: +/-20%; Rated Voltage: 16VDC; Technical Reference: ATBF160102M016DSPAAB000; ComponentLink1Description: Manufacturer; ComponentLink1URL: http://www.we-online.de; ComponentLink2Description: Datasheet; ComponentLink2URL: https://www.we-online.com/catalog/datasheet/860010375017.pdf; Height: 16mm; Mounting Technology: THT; Operating Temperature: -40 to +85degC; Packaging: Ammo Pack; Published Date: May 2020; Capacitance: 1000uF; Diameter: 10mm
footprint WCAP-ATG8_10x16
pins: 1 N, 2 P

## 860010375018
designator C?, comment 1200uF, 16V
WCAP-ATG8 Aluminum Electrolytic Capacitor, Radial, THT, D10xH16mm, 1200uF, 16V; Manufacturer Part Number: 860010375018; Manufacturer: Wurth Elektronik; Dissipation Factor: 16%; Endurance: 2000h; Leakage Current: 192uA; Ripple Current: 979mA; Capacitance Tolerance: +/-20%; Rated Voltage: 16VDC; Technical Reference: ATBF160122M016DSPAAB000; ComponentLink1Description: Manufacturer; ComponentLink1URL: http://www.we-online.de; ComponentLink2Description: Datasheet; ComponentLink2URL: https://www.we-online.com/catalog/datasheet/860010375018.pdf; Height: 16mm; Mounting Technology: THT; Operating Temperature: -40 to +85degC; Packaging: Ammo Pack; Published Date: May 2020; Capacitance: 1200uF; Diameter: 10mm
footprint WCAP-ATG8_10x16
pins: 1 N, 2 P

## 860010375019
designator C?, comment 1500uF, 16V
WCAP-ATG8 Aluminum Electrolytic Capacitor, Radial, THT, D10xH20mm, 1500uF, 16V; Manufacturer Part Number: 860010375019; Manufacturer: Wurth Elektronik; Dissipation Factor: 16%; Endurance: 2000h; Leakage Current: 240uA; Ripple Current: 1100mA; Capacitance Tolerance: +/-20%; Rated Voltage: 16VDC; Technical Reference: ATBF200152M016DSPAAB000; ComponentLink1Description: Manufacturer; ComponentLink1URL: http://www.we-online.de; ComponentLink2Description: Datasheet; ComponentLink2URL: https://www.we-online.com/catalog/datasheet/860010375019.pdf; Height: 20mm; Mounting Technology: THT; Operating Temperature: -40 to +85degC; Packaging: Ammo Pack; Published Date: May 2020; Capacitance: 1500uF; Diameter: 10mm
footprint WCAP-ATG8_10x20
pins: 1 N, 2 P

## 860010378020
designator C?, comment 1800uF, 16V
WCAP-ATG8 Aluminum Electrolytic Capacitor, Radial, THT, D13xH20mm, 1800uF, 16V; Manufacturer Part Number: 860010378020; Manufacturer: Wurth Elektronik; Dissipation Factor: 16%; Endurance: 2000h; Leakage Current: 288uA; Ripple Current: 1298mA; Capacitance Tolerance: +/-20%; Rated Voltage: 16VDC; Technical Reference: ATBI200182M016DSPACB000; ComponentLink1Description: Manufacturer; ComponentLink1URL: http://www.we-online.de; ComponentLink2Description: Datasheet; ComponentLink2URL: https://www.we-online.com/catalog/datasheet/860010378020.pdf; Height: 20mm; Mounting Technology: THT; Operating Temperature: -40 to +85degC; Packaging: Ammo Pack; Published Date: May 2020; Capacitance: 1800uF; Diameter: 13mm
footprint WCAP-ATG8_13x20
pins: 1 N, 2 P

## 860010378021
designator C?, comment 2200uF, 16V
WCAP-ATG8 Aluminum Electrolytic Capacitor, Radial, THT, D13xH20mm, 2200uF, 16V; Manufacturer Part Number: 860010378021; Manufacturer: Wurth Elektronik; Dissipation Factor: 16%; Endurance: 2000h; Leakage Current: 352uA; Ripple Current: 1485mA; Capacitance Tolerance: +/-20%; Rated Voltage: 16VDC; Technical Reference: ATBI200222M016DSPACB000; ComponentLink1Description: Manufacturer; ComponentLink1URL: http://www.we-online.de; ComponentLink2Description: Datasheet; ComponentLink2URL: https://www.we-online.com/catalog/datasheet/860010378021.pdf; Height: 20mm; Mounting Technology: THT; Operating Temperature: -40 to +85degC; Packaging: Ammo Pack; Published Date: May 2020; Capacitance: 2200uF; Diameter: 13mm
footprint WCAP-ATG8_13x20
pins: 1 N, 2 P

## 860010378022
designator C?, comment 2700uF, 16V
WCAP-ATG8 Aluminum Electrolytic Capacitor, Radial, THT, D13xH20mm, 2700uF, 16V; Manufacturer Part Number: 860010378022; Manufacturer: Wurth Elektronik; Dissipation Factor: 16%; Endurance: 2000h; Leakage Current: 432uA; Ripple Current: 1716mA; Capacitance Tolerance: +/-20%; Rated Voltage: 16VDC; Technical Reference: ATBI200272M016DSPACB000; ComponentLink1Description: Manufacturer; ComponentLink1URL: http://www.we-online.de; ComponentLink2Description: Datasheet; ComponentLink2URL: https://www.we-online.com/catalog/datasheet/860010378022.pdf; Height: 20mm; Mounting Technology: THT; Operating Temperature: -40 to +85degC; Packaging: Ammo Pack; Published Date: May 2020; Capacitance: 2700uF; Diameter: 13mm
footprint WCAP-ATG8_13x20
pins: 1 N, 2 P
